# Altium footprint library lib_datalogger.PcbLib: 866 footprints (part 12 of 55)
Each footprint in its own frame and in the unit in brackets; x right, y up, seen from the top. Pads: shape width x height; smd on the part's side, far side on the other; paste and mask are expansions set on the pad; w line width, h text height; cw(c..) or ccw(c..) is an arc to the next point about the centre after c.
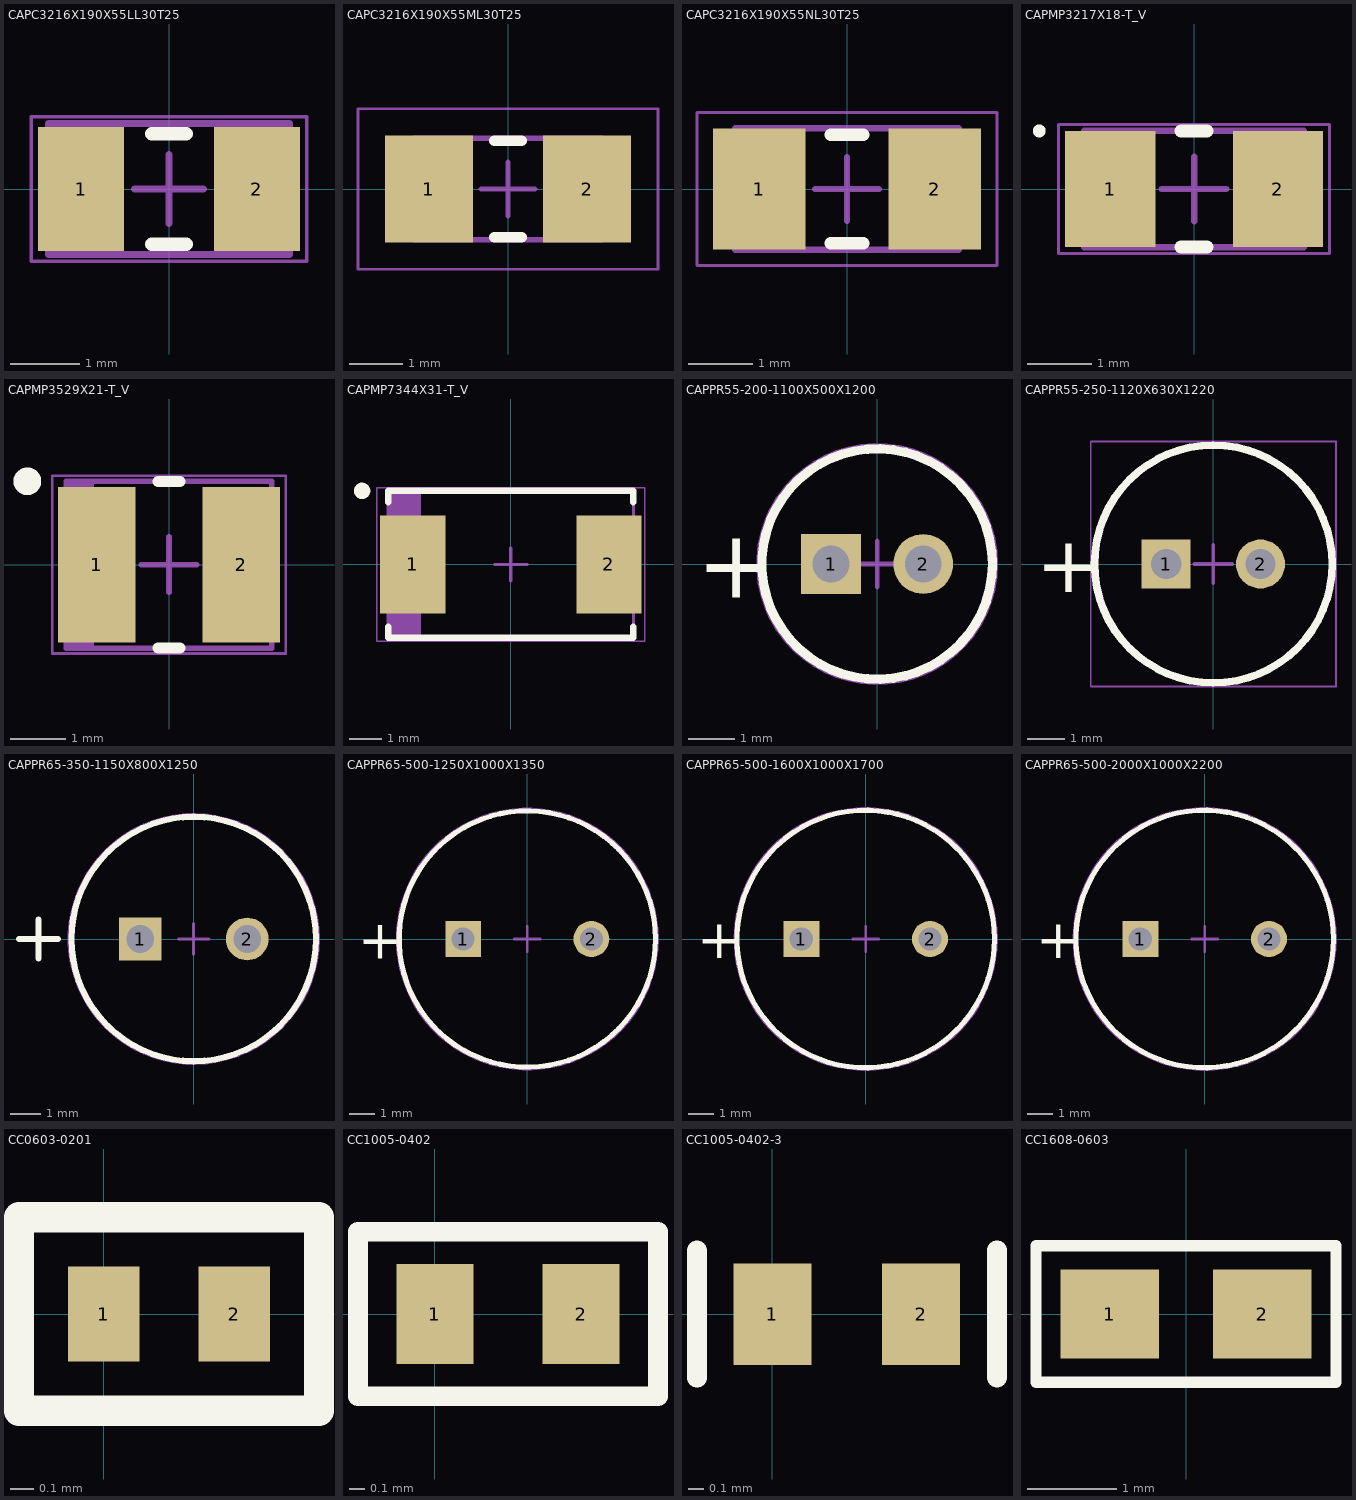
[diagram p11: the footprints below, top view; thin cyan lines are the x and y axes]

## CAPC3216X190X55LL30T25 [mm] "Chip Capacitor, 2-Leads, Body 3.5x1.9mm, IPC High Density"
height 1.9
pads (2):
  rect 1.25x1.8 smd: 1(-1.275,0) 2(1.275,0)
Top Overlay:
  lines w0.2: -0.25,-0.8 0.25,-0.8 ; -0.25,0.8 0.25,0.8
Mechanical 13:
  lines w0.1: -1.75,-0.95 1.75,-0.95 1.75,0.95 -1.75,0.95 -1.75,-0.95
Mechanical 15:
  lines w0.05: -2,-1.05 2,-1.05 2,1.05 -2,1.05 -2,-1.05
  lines w0.1: -0.5,0 0.5,0 ; 0,-0.5 0,0.5
3D body "CAPC3216X19L.step": height 1.9, standoff 0, extent -1.75,-0.95 1.75,0.95

## CAPC3216X190X55ML30T25 [mm] "Chip Capacitor, 2-Leads, Body 3.5x1.9mm, IPC Low Density"
height 1.9
pads (2):
  rect 1.65x2 smd: 1(-1.475,0) 2(1.475,0)
Top Overlay:
  lines w0.2: -0.25,-0.9 0.25,-0.9 ; -0.25,0.9 0.25,0.9
Mechanical 13:
  lines w0.1: -1.75,-0.95 -1.75,0.95 1.75,0.95 1.75,-0.95 -1.75,-0.95
Mechanical 15:
  lines w0.05: -2.8,-1.5 -2.8,1.5 2.8,1.5 2.8,-1.5 -2.8,-1.5
  lines w0.1: -0.5,0 0.5,0 ; 0,-0.5 0,0.5
3D body "CAPC3216X19M.step": height 1.9, standoff 0, extent -1.75,-0.95 1.75,0.95

## CAPC3216X190X55NL30T25 [mm] "Chip Capacitor, 2-Leads, Body 3.5x1.9mm, IPC Medium Density"
height 1.9
pads (2):
  rect 1.45x1.9 smd: 1(-1.375,0) 2(1.375,0)
Top Overlay:
  lines w0.2: -0.25,-0.85 0.25,-0.85 ; -0.25,0.85 0.25,0.85
Mechanical 13:
  lines w0.1: -1.75,-0.95 1.75,-0.95 1.75,0.95 -1.75,0.95 -1.75,-0.95
Mechanical 15:
  lines w0.05: -2.35,-1.2 2.35,-1.2 2.35,1.2 -2.35,1.2 -2.35,-1.2
  lines w0.1: -0.5,0 0.5,0 ; 0,-0.5 0,0.5
3D body "CAPC3216X19N.step": height 1.9, standoff 0, extent -1.75,-0.95 1.75,0.95

## CAPMP3217X18-T_V [mm] "Molded Capacitor, 2-Leads, Body 3.40x1.8mm"
height 1.8
pads (2):
  rect 1.4x1.8 smd: 1(-1.3,0) 2(1.3,0)
Top Overlay:
  circle w0.1: c-2.4,0.9 r0.05
  lines w0.2: -0.2,-0.9 0.2,-0.9 ; -0.2,0.9 0.2,0.9
Mechanical 13:
  region: -1.243,0.9 -1.7,0.9 -1.7,-0.9 -1.243,-0.9
  lines w0.1: -1.7,-0.9 1.7,-0.9 1.7,0.9 -1.7,0.9 -1.7,-0.9
Mechanical 15:
  lines w0.05: -2.1,-1 -2.1,1 2.1,1 2.1,-1 -2.1,-1
  lines w0.1: -0.5,0 0.5,0 ; 0,-0.5 0,0.5
3D body "CAPMP3217X18L.step": height 1.8, standoff 0, extent -1.92,-0.9 1.92,0.9

## CAPMP3529X21-T_V [mm] "Molded Capacitor, 2-Leads, Body 3.70x3mm"
height 2.1
pads (2):
  rect 1.4x2.8 smd: 1(-1.3,0) 2(1.3,0)
Top Overlay:
  circle w0.25: c-2.55,1.5 r0.125
  lines w0.2: -0.2,-1.5 0.2,-1.5 ; -0.2,1.5 0.2,1.5
Mechanical 13:
  region: -1.352,1.5 -1.85,1.5 -1.85,-1.5 -1.352,-1.5
  lines w0.1: -1.85,-1.5 -1.85,1.5 1.85,1.5 1.85,-1.5 -1.85,-1.5
Mechanical 15:
  lines w0.05: -2.1,-1.6 -2.1,1.6 2.1,1.6 2.1,-1.6 -2.1,-1.6
  lines w0.1: -0.5,0 0.5,0 ; 0,-0.5 0,0.5
3D body "CAPMP3529X21L.step": height 2.1, standoff 0, extent -2.07,-1.5 2.07,1.5

## CAPMP7344X31-T_V [mm] "Molded Capacitor, 2-Leads, Body 7.50x4.5mm"
height 3.1
pads (2):
  rect 2x3 smd: 1(-3,0) 2(3,0)
Top Overlay:
  circle w0.25: c-4.55,2.25 r0.125
  lines w0.2: -3.75,-1.9 -3.75,-2.25 3.75,-2.25 3.75,-1.9 ; -3.75,1.9 -3.75,2.25 3.75,2.25 3.75,1.9
Mechanical 13:
  region: -2.741,2.25 -3.75,2.25 -3.75,-2.25 -2.741,-2.25
  lines w0.1: -3.75,-2.25 -3.75,2.25 3.75,2.25 3.75,-2.25 -3.75,-2.25
Mechanical 15:
  lines w0.05: -4.1,-2.35 -4.1,2.35 4.1,2.35 4.1,-2.35 -4.1,-2.35
  lines w0.1: -0.5,0 0.5,0 ; 0,-0.5 0,0.5
3D body "CAPMP7344X31L.step": height 3.1, standoff 0, extent -3.97,-2.25 3.97,2.25

## CAPPR55-200-1100X500X1200 [mm] "THD, 2-Leads, Dia 5mm, Pin Spacing 2mm"
height 12
pads (2):
  rect 1.3x1.3 hole 0.8: 1(-1,0)
  round 1.3 hole 0.8: 2(1,0)
Top Overlay:
  circle w0.2: c0,0 r2.5
  text "+" at -3.908,-0.737 h1.5
Mechanical 13:
  circle w0.1: c0,0 r2.5
Mechanical 15:
  circle w0.05: c0,0 r2.6
  lines w0.1: -0.5,0 0.5,0 ; 0,-0.5 0,0.5
3D body: height 12, standoff 0, extent -2,-2 1.999,1.999
3D body: height 11.89, standoff 0.02, extent -2.449,-2.449 2.449,2.449
3D body: height 12, standoff 0.01, extent -2.499,-2.499 2.432,2.499
3D body: height 0, standoff -14, extent 0.752,-0.249 1.25,0.25
3D body: height 0, standoff -17, extent -1.248,-0.249 -0.75,0.25

## CAPPR55-250-1120X630X1220 [mm] "THD, 2-Leads, Dia 6.3mm, Pin Spacing 2.5mm"
height 12.2
pads (2):
  rect 1.3x1.3 hole 0.8: 1(-1.25,0)
  round 1.3 hole 0.8: 2(1.25,0)
Top Overlay:
  circle w0.2: c0,0 r3.15
  text "+" at -4.7,-0.75 h1.5
Mechanical 13:
  circle w0.1: c0,0 r3.15
Mechanical 15:
  lines w0.05: -3.25,-3.25 3.25,-3.25 3.25,3.25 -3.25,3.25 -3.25,-3.25
  lines w0.1: -0.5,0 0.5,0 ; 0,-0.5 0,0.5
3D body "PNSC-ECA-1VM101.stp": height 12.21, standoff -4, extent -3.15,-3.15 3.16,3.15

## CAPPR65-350-1150X800X1250 [mm] "THD, 2-Leads, Dia 8mm, Pin Spacing 3.5mm"
height 12.5
pads (2):
  rect 1.4x1.4 hole 0.9: 1(-1.75,0)
  round 1.4 hole 0.9: 2(1.75,0)
Top Overlay:
  circle w0.2: c0,0 r4
  lines w0.2: -5.715,0 -4.445,0 ; -5.08,-0.635 -5.08,0.635
Mechanical 13:
  circle w0.1: c0,0 r4
Mechanical 15:
  circle w0.05: c0,0 r4.1
  lines w0.1: -0.5,0 0.5,0 ; 0,-0.5 0,0.5
3D body: height 12.5, standoff 0, extent -3.499,-3.499 3.499,3.499
3D body: height 12.49, standoff 0.01, extent -3.949,-3.949 3.949,3.949
3D body: height 12.5, standoff 0, extent -3.999,-3.999 3.926,3.999
3D body: height 0, standoff -17, extent -2.047,-0.299 -1.45,0.3
3D body: height 0, standoff -14, extent 1.453,-0.299 2.05,0.3

## CAPPR65-500-1250X1000X1350 [mm] "THD, 2-Leads, Dia 10mm, Body Length 12.5mm"
height 13.5
pads (2):
  rect 1.4x1.4 hole 0.9: 1(-2.5,0)
  round 1.4 hole 0.9: 2(2.5,0)
Top Overlay:
  circle w0.2: c0,0 r5
  text "+" at -6.604,-0.762 h1.5
Mechanical 13:
  circle w0.1: c0,0 r5
Mechanical 15:
  circle w0.05: c0,0 r5.1
  lines w0.1: -0.5,0 0.5,0 ; 0,-0.5 0,0.5
3D body: height 0, standoff -14, extent 2.202,-0.299 2.8,0.3
3D body: height 0, standoff -17, extent -2.797,-0.299 -2.2,0.3
3D body: height 13.5, standoff 0, extent -4.499,-4.499 4.499,4.499
3D body: height 13.49, standoff 0.01, extent -4.949,-4.949 4.949,4.949
3D body: height 13.5, standoff 0, extent -4.999,-4.999 4.835,4.999

## CAPPR65-500-1600X1000X1700 [mm] "THD, 2-Leads, Dia 10mm, Body Length 16mm"
height 17
pads (2):
  rect 1.4x1.4 hole 0.9: 1(-2.5,0)
  round 1.4 hole 0.9: 2(2.5,0)
Top Overlay:
  circle w0.2: c0,0 r5
  text "+" at -6.55,-0.75 h1.5
Mechanical 13:
  circle w0.1: c0,0 r5
Mechanical 15:
  circle w0.05: c0,0 r5.1
  lines w0.1: -0.5,0 0.5,0 ; 0,-0.5 0,0.5
3D body: height 0, standoff -17, extent -2.797,-0.299 -2.2,0.3
3D body: height 0, standoff -14, extent 2.203,-0.299 2.8,0.3
3D body: height 17, standoff 0, extent -4.499,-4.499 4.499,4.499
3D body: height 16.99, standoff 0.01, extent -4.949,-4.949 4.949,4.949
3D body: height 17, standoff 0, extent -4.999,-4.999 4.867,4.999

## CAPPR65-500-2000X1000X2200 [mm] "THD, 2-Leads, Dia 10mm, Pin Spacing 5mm"
height 22
pads (2):
  rect 1.4x1.4 hole 0.9: 1(-2.5,0)
  round 1.4 hole 0.9: 2(2.5,0)
Top Overlay:
  circle w0.2: c0,0 r5
  text "+" at -6.55,-0.75 h1.5
Mechanical 13:
  circle w0.1: c0,0 r5
Mechanical 15:
  circle w0.05: c0,0 r5.1
  lines w0.1: -0.5,0 0.5,0 ; 0,-0.5 0,0.5
3D body: height 0, standoff -17, extent -2.797,-0.299 -2.2,0.3
3D body: height 0, standoff -14, extent 2.203,-0.299 2.8,0.3
3D body: height 22, standoff 0, extent -4.999,-4.999 4.622,5
3D body: height 21.9, standoff 0.01, extent -4.949,-4.949 4.95,4.95
3D body: height 22, standoff 0.05, extent -3.999,-3.999 4,4

## CC0603-0201 [mm] "Chip Capacitor; Body 0.024\" L x 0.012\" W (0.60mm x 0.30mm)"
height 0.33
pads (2):
  rect 0.3x0.4 smd: 1(0,0) 2(0.55,0)
Top Overlay:
  lines w0.127: -0.356,-0.406 0.906,-0.406 0.906,0.406 -0.356,0.406 -0.356,-0.406
3D body "cc-0201.step": height 0.15, standoff -0.15, extent -0.046,-0.15 0.554,0.15

## CC1005-0402 [mm] "Chip Capacitor; Body 0.039\" L x 0.020\" W (1.00mm x 0.50mm)"
height 1.35
pads (2):
  rect 0.5x0.65 smd: 1(0,0) 2(0.95,0)
Top Overlay:
  lines w0.127: -0.5,-0.533 -0.5,0.533 1.45,0.533 1.45,-0.533 -0.5,-0.533
3D body "0402 SMD CAPACITOR.step": height 0.49, standoff -0.01, extent -0.025,-0.25 0.975,0.25

## CC1005-0402-3 [mm] "Chip Capacitor; Body 0.039\" L x 0.020\" W (1.00mm x 0.50mm)"
height 1.35
pads (2):
  rect 0.5x0.65 smd: 1(0,0) 2(0.95,0)
Top Overlay:
  lines w0.127: -0.483,-0.406 -0.483,0.406 ; 1.435,-0.404 1.435,0.409
3D body "0402 SMD CAPACITOR.step": height 0.49, standoff -0.01, extent -0.025,-0.25 0.975,0.25

## CC1608-0603 [mm] "Chip Capacitor; Body 1.6 x 0.8 mm (LxW typ)"
height 1.35
pads (2):
  rect 1.1x1 smd: 1(-0.85,0) 2(0.85,0)
Top Overlay:
  lines w0.127: -1.676,-0.762 -1.676,0.762 1.676,0.762 1.676,-0.762 -1.676,-0.762
3D body "User Library-SMD CAPACITOR.step": height 0.8, standoff 0, extent -0.8,-0.4 0.8,0.4